# Altium footprint library My Library.PcbLib: 872 footprints (part 12 of 55)
Each footprint in its own frame and in the unit in brackets; x right, y up, seen from the top. Pads: shape width x height; smd on the part's side, far side on the other; paste and mask are expansions set on the pad; w line width, h text height; cw(c..) or ccw(c..) is an arc to the next point about the centre after c.
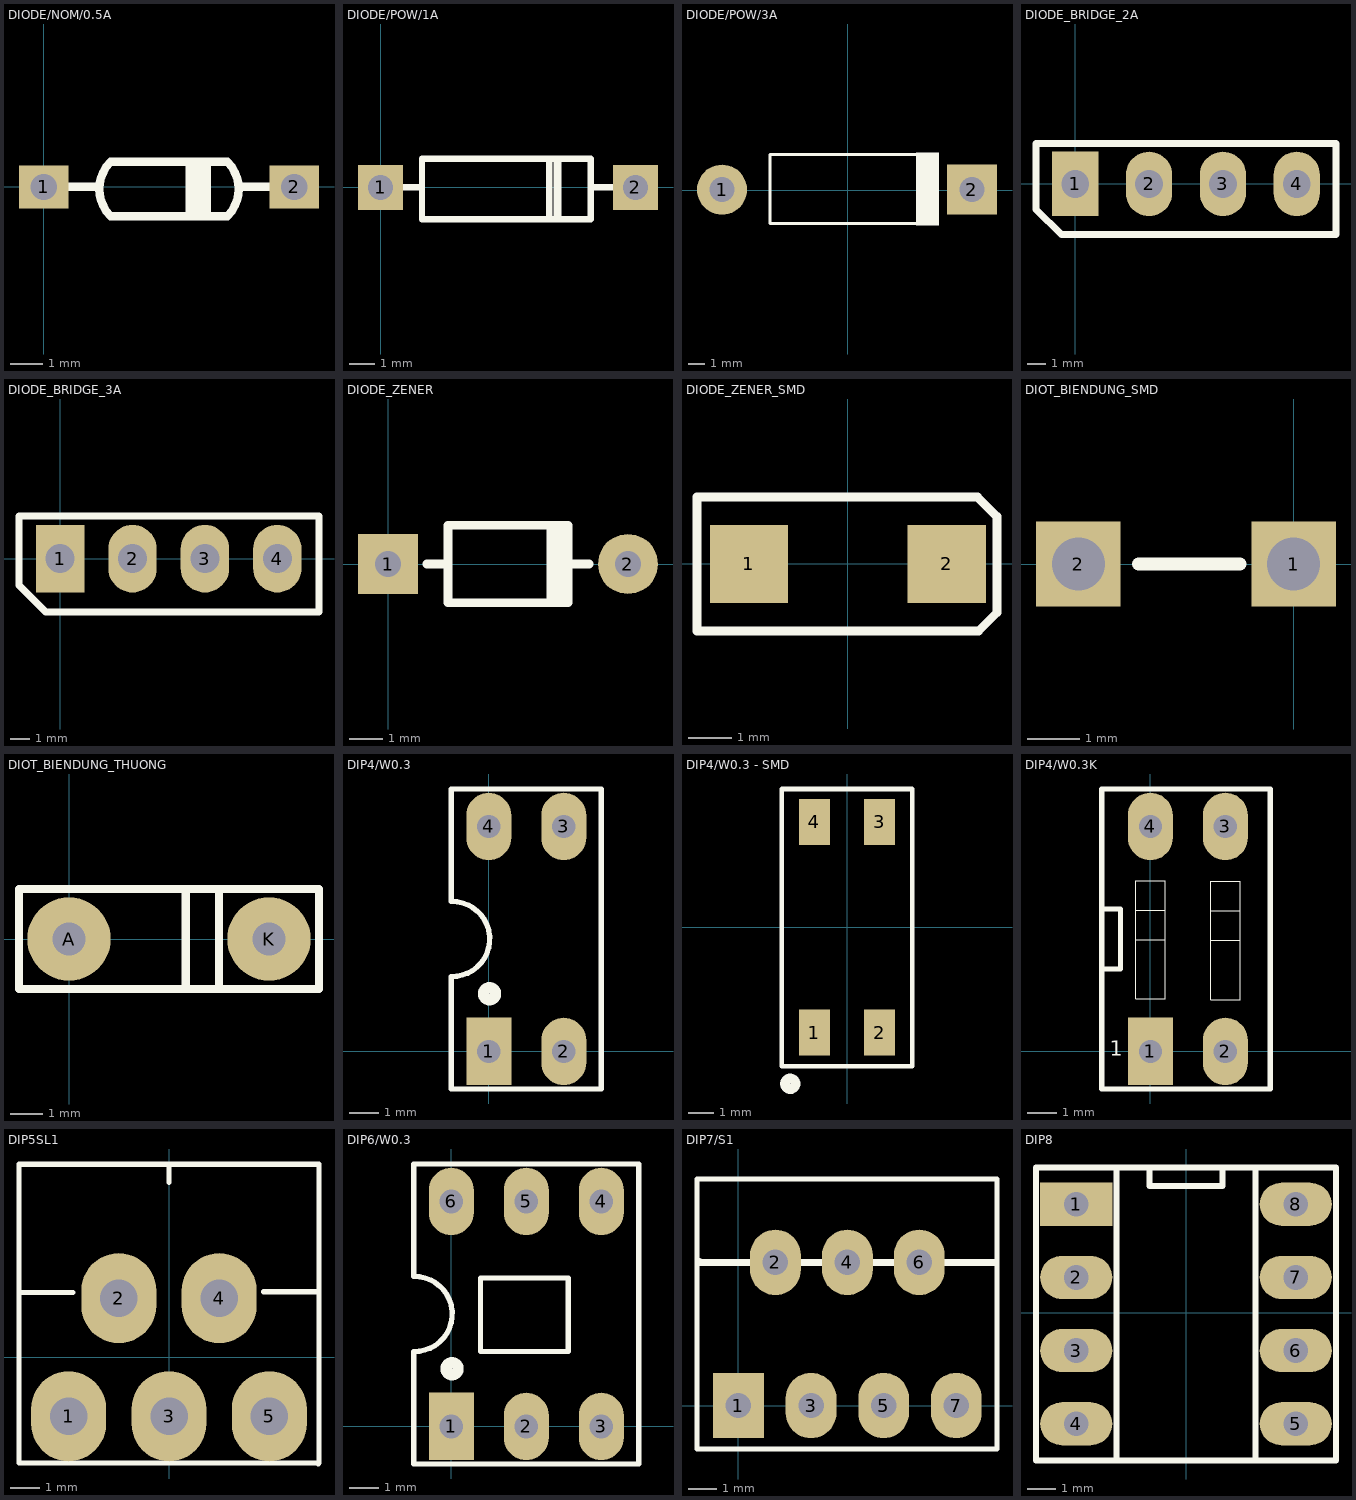
[diagram p11: the footprints below, top view; thin cyan lines are the x and y axes]

## DIODE/NOM/0.5A [mm]
pads (2):
  rect 1.5x1.3 hole 0.8: 1(0,0) 2(7.62,0)
Top Overlay:
  lines w0.254: 0.635,0 1.651,0 ; 4.445,-0.762 4.445,0.762 ; 4.699,-0.889 4.699,0.762 ; 4.953,-0.889 4.953,0.762 ; 5.969,0 7.112,0 ; 2.032,-0.889 cw(c2.857,-0.064) 2.032,0.762 5.588,0.762 cw(c4.763,-0.064) 5.588,-0.889 2.032,-0.889

## DIODE/POW/1A [mm]
pads (2):
  rect 1.8x1.8 hole 1: 1(0,0) 2(10.16,0)
Top Overlay:
  lines w0.2: 6.985,-1.27 6.985,1.143 ; 7.112,-1.27 7.112,1.143
  lines w0.254: 0.635,0 1.651,0 ; 6.731,-1.27 6.731,1.143 ; 8.382,0 9.525,0 ; 1.651,-1.27 1.651,1.143 8.382,1.143 8.382,-1.27 1.651,-1.27
3D body "SW3DPS-DIODE0_4.step": height 2.55, standoff -2.54, extent -0.381,-1.283 10.541,1.283

## DIODE/POW/3A [mil]
pads (2):
  round 120 hole 60: 1(-301,1)
  rect 120x120 hole 60: 2(298,1)
Top Overlay:
  rectangle: 164,-85 219,90
  lines w7.87: 214,-65 199,-80 -186,-80 -186,85 194,85 214,65
3D body "User Library-BYW98.step": height 248.03, standoff -92.52, extent -320.86,-104.33 320.87,104.33

## DIODE_BRIDGE_2A [mil]
height 209.84
pads (4):
  rect 100x140 hole 60: 1(0,0)
  oval 100x140 hole 60: 2(160,0) 3(320,0) 4(480,0)
Top Overlay:
  lines w15: -85,-55 -30,-110 565,-110 565,88 -85,88 -85,-55
3D body "User Library-KBP210.STEP": height 433.57, standoff -156.98, extent -74.96,-98.74 554.96,58.74

## DIODE_BRIDGE_3A [mil]
height 209.84
pads (4):
  rect 100x140 hole 60: 1(0,0)
  oval 100x140 hole 60: 2(149.61,0) 3(299.21,0) 4(448.82,0)
Top Overlay:
  lines w15: -85,-55 -30,-110 535,-110 535,88 -85,88 -85,-55
3D body "User Library-KBP303G.STEP": height 459.84, standoff -118.11, extent -75,-101.77 525,51.77

## DIODE_ZENER [mil]
pads (2):
  rect 70x70 hole 30: 1(0,0)
  round 70 hole 30: 2(280,0)
Top Overlay:
  lines w10: 45,0 70,0 ; 190,-45 190,45 ; 200,-45 200,45 ; 235,0 210,0 ; 210,0 210,-45 70,-45 70,45 210,45 210,0
3D body "User Library-1n4148-1.STEP": height 89.37, standoff -166.54, extent -8,-39.37 287.28,39.37

## DIODE_ZENER_SMD [mil]
pads (2):
  rect 70x70 smd: 1(-88.58,0) 2(88.58,0)
Top Overlay:
  lines w7.87: -135,-60 117,-60 133.54,-43.46 133.54,0 133.54,42.46 116,60 -135,60 -135,-60
3D body "User Library-smd diode 1206.STEP": height 56.54, standoff -0.54, extent -68.9,-28.55 68.89,28.54

## DIOT_BIENDUNG_SMD [mm]
pads (2):
  rect 1.6x1.6 hole 1: 1(0,0) 2(-4.064,0)
Top Overlay:
  lines w0.254: -2.928,0 -1.016,0

## DIOT_BIENDUNG_THUONG [mm]
pads (2):
  round 2.54 hole 1: A(0,0) K(6.096,0)
Top Overlay:
  lines w0.254: 3.556,-1.524 3.556,1.524 ; 4.572,-1.524 4.572,1.524 ; -1.524,-1.524 -1.524,1.524 7.62,1.524 7.62,-1.524 -1.524,-1.524

## DIP4/W0.3 [mil] "4 PIN, W 300mil, Pin to pin 100mil"
height 100
pads (4):
  rect 60x90 hole 31: 1(0,0)
  oval 60x90 hole 31: 2(100,0) 3(100,300) 4(0,300)
Top Overlay:
  circle w15: c1,77 r8
  lines w7: -50.38,100.05 ccw(c-48.69,150.02) -50,200 ; -50,100 -50,-50 150,-50 150,350 -50,350 -50,201
3D body "SW3DPS-DIP4-DEFAULT.STEP": height 169.69, standoff -129.13, extent -59.06,-10 159.06,304.96

## DIP4/W0.3 - SMD [mm] "4 PIN, W 300mil, Pin to pin 100mil"
height 2.54
pads (4):
  rect 1.2x1.8 smd: 1(-1.27,-4.1) 2(1.27,-4.1) 3(1.27,4.1) 4(-1.27,4.1)
Top Overlay:
  circle w0.381: c-2.21,-6.096 r0.203
  lines w0.178: -2.54,-5.41 -2.54,-1.27 -2.54,5.385 2.54,5.385 2.54,-5.41 -2.54,-5.41
3D body: height 3.5, standoff 0.1, extent -2.311,-3.251 2.286,3.251
3D body: height 0.36, standoff 0.1, extent 0.813,3.759 1.727,4.75
3D body: height 1.8, standoff 0.1, extent 0.813,3.759 1.727,3.912
3D body: height 2.06, standoff 1.8, extent 0.813,3.2 1.727,3.912
3D body: height 2.06, standoff 1.8, extent -1.727,3.2 -0.813,3.912
3D body: height 1.8, standoff 0.1, extent -1.727,3.759 -0.813,3.912
3D body: height 0.36, standoff 0.1, extent -1.727,3.759 -0.813,4.75
3D body: height 2.06, standoff 1.8, extent 0.813,-3.912 1.727,-3.2
3D body: height 1.8, standoff 0.1, extent 0.813,-3.912 1.727,-3.759
3D body: height 0.36, standoff 0.1, extent 0.813,-4.75 1.727,-3.759
3D body: height 2.06, standoff 1.8, extent -1.727,-3.912 -0.813,-3.2
3D body: height 1.8, standoff 0.1, extent -1.727,-3.912 -0.813,-3.759
3D body: height 0.36, standoff 0.1, extent -1.727,-4.75 -0.813,-3.759

## DIP4/W0.3K [mil] "4 PIN, W 400mil , L 450mil,Pin to pin 100mil"
height 100
pads (4):
  rect 60x90 hole 31: 1(0,0)
  oval 60x90 hole 31: 2(100,0) 3(100,300) 4(0,300)
Top Overlay:
  lines w1.5: -19.68,149 19.68,149 ; -19.68,188.37 19.68,188.37 ; 80.31,148 119.69,148 ; 80.31,187.37 119.69,187.37 ; -19.68,70.26 19.68,70.26 19.68,227.74 -19.68,227.74 -19.68,70.26 ; 80.31,69.26 119.69,69.26 119.69,226.74 80.31,226.74 80.31,69.26
  lines w7: -65,110 -40,110 -40,190 -65,190 ; -65,-50 160,-50 160,350 -65,350 -65,-50
  text "1" at -54,-6 h20
3D body "User Library-Switch-Piano-DIP-2.STEP": height 354.33, standoff -157.48, extent -66.22,-103.43 170,343.43

## DIP5SL1 [mm]
pads (5):
  oval 2.54x3.048 hole 1.27: 1(-3.4,-2) 2(-1.7,2) 3(0,-2) 4(1.7,2) 5(3.4,-2)
Top Overlay:
  lines w0.178: -5.076,2.191 -3.248,2.191 ; 0,5.918 0,6.502 ; 3.204,2.216 5.033,2.216 ; -5.08,-3.581 -5.08,6.534 5.08,6.534 5.08,-3.581 5.055,-3.607 5.029,-3.581 -5.08,-3.581
3D body "TO220-5.STEP": height 18.81, standoff -9.47, extent -4.993,-2.246 5.207,6.31

## DIP6/W0.3 [mil] "6 PIN, W 300mil, Pin to pin 100mil"
height 100
pads (6):
  rect 60x90 hole 31.5: 1(0,0)
  oval 60x90 hole 31.5: 2(100,0) 3(200,0) 4(200,300) 5(100,300) 6(0,300)
Top Overlay:
  circle w15: c1,77 r8
  lines w7: -50.38,100.05 ccw(c-48.69,150.02) -50,200 ; -50,100 -50,-50 250,-50 250,350 -50,350 -50,201 ; 39,100 156,100 156,198 39,198 39,100
3D body "SW3DPS-DIP6-DEFAULT.STEP": height 169.69, standoff -129.13, extent -58.11,-7.48 260,307.48

## DIP7/S1 [mil]
pads (7):
  rect 70x90 hole 35: 1(0,0)
  oval 70x90 hole 35: 2(51,197) 3(100,0) 4(150,197) 5(200,0) 6(249,197) 7(300,0)
Top Overlay:
  lines w7: -57,-60 356,-60 356,312 -57,312 -57,-60
  lines w10: -54,198 -54,197 354,197
3D body "User Library-TO-220(T).STEP": height 756.77, standoff -77.87, extent -50.57,-11.02 351,311.02

## DIP8 [mm]
pads (8):
  rect 2.5x1.5 hole 0.864: 1(-3.81,3.759)
  oval 2.5x1.5 hole 0.864: 2(-3.81,1.219) 3(-3.81,-1.321) 4(-3.81,-3.861) 5(3.81,-3.861) 6(3.81,-1.321) 7(3.81,1.219) 8(3.81,3.759)
Top Overlay:
  lines w0.203: -2.286,-5.131 2.54,-5.131 ; -2.286,5.029 -1.27,5.029 ; 2.54,5.029 -2.54,5.029 2.413,5.029 2.413,-5.131 5.207,-5.131 5.207,5.029 1.27,5.029 ; -1.27,4.394 -1.27,5.029 ; -1.27,4.394 1.27,4.394 ; -1.27,4.394 -1.27,5.029 ; -1.27,4.394 1.27,4.394 ; -1.27,5.029 1.27,5.029 ; 1.27,4.394 1.27,5.029 ; 1.27,4.394 1.27,5.029 ; 2.54,-5.131 -5.207,-5.131 -5.207,5.029 -2.413,5.029 -2.413,-5.131 2.54,-5.131
3D body "User Library-8pin 0_3inch 2_54mm IC DIP Gold Socket.STEP": height 5.01, standoff -2.99, extent -5.08,-5.111 5.08,5.049
3D body "User Library-DIP8-300-metric.step": height 8.1, standoff 0.1, extent -3.88,-5.4 3.88,5.4